# Altium footprint library custom.PcbLib: 305 footprints (part 20 of 20)
Each footprint in its own frame and in the unit in brackets; x right, y up, seen from the top. Pads: shape width x height; smd on the part's side, far side on the other; paste and mask are expansions set on the pad; w line width, h text height; cw(c..) or ccw(c..) is an arc to the next point about the centre after c.
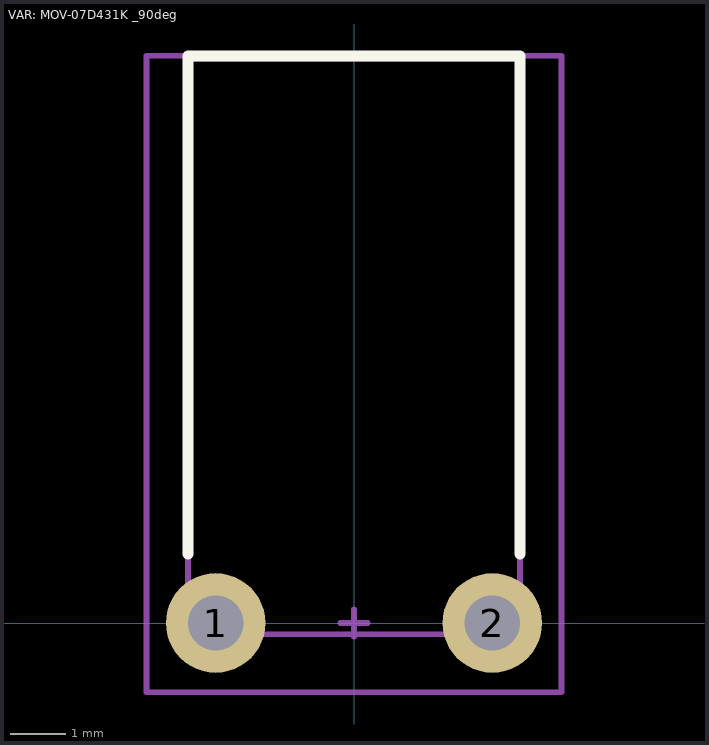
[diagram p19: the footprint, top view; thin cyan lines are the x and y axes]

## VAR: MOV-07D431K _90deg [mm]
pads (3):
  round 1.8 hole 1: 1(-2.5,0) 2(2.5,0)
  round 0.5 on Mech1: ""(-2.5,0.25)
Top Overlay:
  lines w0.2: -3,1.25 -3,10.25 3,10.25 3,1.25
Top Assy:
  lines w0.1: -3,-0.2 3,-0.2 3,10.2 -3,10.2 -3,-0.2
Size Area:
  lines w0.1: -0.25,0 0.25,0 ; 0,-0.25 0,0.25 ; -3.75,-1.25 3.75,-1.25 3.75,10.25 -3.75,10.25 -3.75,-1.25
3D body "DEBB33D_90.STEP": height 4.02, standoff -1.98, extent -3,-0.2 3,10.2